# Altium footprint library TarabusLibrary.PcbLib: 591 footprints (part 13 of 37)
Each footprint in its own frame and in the unit in brackets; x right, y up, seen from the top. Pads: shape width x height; smd on the part's side, far side on the other; paste and mask are expansions set on the pad; w line width, h text height; cw(c..) or ccw(c..) is an arc to the next point about the centre after c.
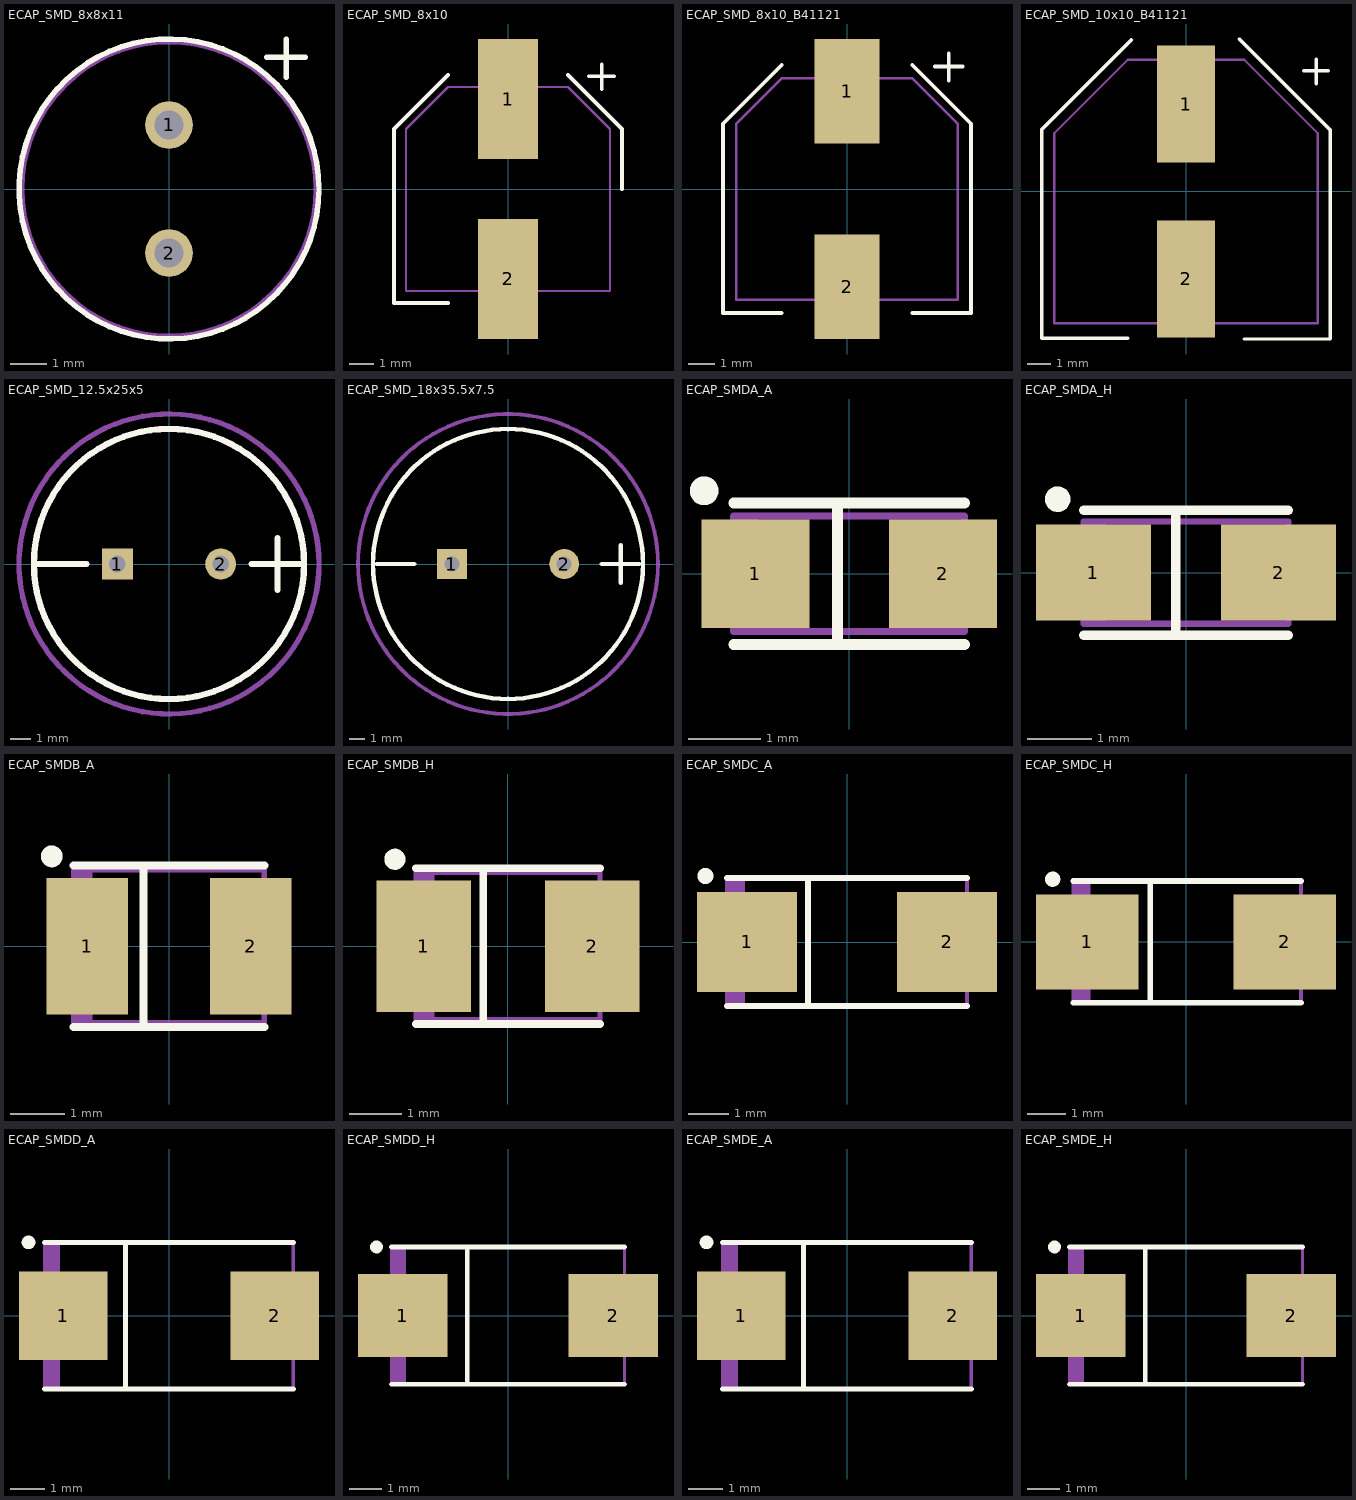
[diagram p12: the footprints below, top view; thin cyan lines are the x and y axes]

## ECAP_SMD_8x8x11 [mm]
pads (2):
  round 1.3 hole 0.8: 1(0,1.75) 2(0,-1.75)
Top Overlay:
  circle w0.15: c0,0 r4.1
  lines w0.15: 2.675,3.6 3.725,3.6 ; 3.2,3.05 3.2,4.1
Mechanical 7:
  circle w0.1: c0,0 r4
Mechanical 9:
  circle w0.1: c0,0 r4
Mechanical 10:
  text ".Comment" at 1,-4.75 h0.6
  text ".Designator" at 0.75,4.75 h0.8
3D body: height 12, standoff 0.5, extent -3.968,-3.992 4,3.992

## ECAP_SMD_8x10 [mm]
height 10
pads (2):
  rect 2.5x5 smd: 1(0,3.75) 2(0,-3.75)
Top Overlay:
  lines w0.15: -2.5,-4.75 -4.75,-4.75 -4.75,-4.25 -4.75,2.5 -2.5,4.75 ; 2.5,4.75 4.75,2.5 4.75,0 ; 3.375,4.7 4.425,4.7 ; 3.9,4.15 3.9,5.2
Mechanical 7:
  lines w0.1: -4.25,-4.25 -4.25,2.5 -2.5,4.25 2.5,4.25 4.25,2.5 4.25,-4.25 -4.25,-4.25
Mechanical 10:
  text ".Comment" at -1.125,-0.7 h0.6
  text ".Designator" at -1.05,0.3 h0.8
3D body "User Library-ALU-F.STEP": height 10.2, standoff 0, extent -4.15,-4.95 4.15,4.95

## ECAP_SMD_8x10_B41121 [mm]
height 10
pads (2):
  rect 2.5x4 smd: 1(0,3.75) 2(0,-3.75)
Top Overlay:
  lines w0.15: -2.5,-4.75 -4.75,-4.75 -4.75,2.5 -2.5,4.75 ; 2.5,-4.75 4.75,-4.75 4.75,2.5 2.5,4.75 ; 3.375,4.7 4.425,4.7 ; 3.9,4.15 3.9,5.2
Mechanical 7:
  lines w0.1: -4.25,-4.25 4.25,-4.25 4.25,2.5 2.5,4.25 -2.5,4.25 -4.25,2.5 -4.25,-4.25
Mechanical 10:
  text ".Designator" at -1.05,0.3 h0.8
  text ".Comment" at -1.125,-0.7 h0.6
3D body "User Library-ALU-F.STEP": height 10.2, standoff 0, extent -4.15,-4.95 4.15,4.95

## ECAP_SMD_10x10_B41121 [mm]
height 10
pads (2):
  rect 2.5x5 smd: 1(0,3.75) 2(0,-3.75)
Top Overlay:
  lines w0.15: -2.5,-6.3 -6.175,-6.3 -6.175,2.675 -2.338,6.513 ; 2.288,6.538 6.175,2.65 6.175,-6.325 2.5,-6.325 ; 5.05,5.175 6.1,5.175 ; 5.575,4.625 5.575,5.675
Mechanical 7:
  lines w0.1: -5.65,-5.65 -5.65,2.5 -2.5,5.65 2.5,5.65 5.65,2.5 5.65,-5.65 -5.65,-5.65
Mechanical 10:
  text ".Designator" at -1.05,0.3 h0.8
  text ".Comment" at -1.125,-0.7 h0.6

## ECAP_SMD_12.5x25x5 [mm] "12.5x25x5"
height 25
pads (2):
  rect 1.5x1.5 hole 0.8: 1(-2.5,0)
  round 1.5 hole 0.8: 2(2.5,0)
Top Overlay:
  circle w0.3: c0,0 r6.53
  lines w0.3: -6.5,0 -4,0 ; 4,0 6.5,0 ; 5.25,-1.25 5.25,1.25
Mechanical 1:
  circle w0.254: c0,0 r7.25

## ECAP_SMD_18x35.5x7.5 [mm] "18x35.5x7.5"
height 35.5
pads (2):
  rect 2x2 hole 1: 1(-3.75,0)
  round 2 hole 1: 2(3.75,0)
Top Overlay:
  circle w0.3: c0,0 r9
  lines w0.3: -8.75,0 -6.25,0 ; 6.25,0 8.75,0 ; 7.5,-1.25 7.5,1.25
Mechanical 1:
  circle w0.254: c0,0 r10

## ECAP_SMDA_A [mm]
height 1.6
pads (2):
  rect 1.5x1.5 smd: 1(-1.3,0) 2(1.3,0)
Top Overlay:
  circle w0.2: c-2.01,1.15 r0.1
  lines w0.15: -1.6,-0.98 1.6,-0.98 ; -1.6,0.98 1.6,0.98 ; -0.16,-0.98 -0.16,0.98
Mechanical 7:
  lines w0.1: -1.5,-0.8 -1.5,0.8 ; -1.4,-0.8 -1.4,0.8 ; -1.3,-0.8 -1.3,0.8 ; -1.6,-0.8 -1.6,0.8 1.6,0.8 1.6,-0.8 -1.6,-0.8
Mechanical 10:
  text ".Designator" at -0.84,1.25 h0.8
  text ".Comment" at -0.88,-1.58 h0.6
3D body: height 1.6, standoff 0, extent -1.6,-0.8 1.6,0.8

## ECAP_SMDA_H [mm]
height 1.6
pads (2):
  rect 1.8x1.5 smd: 1(-1.45,0) 2(1.45,0)
Top Overlay:
  circle w0.2: c-2.01,1.15 r0.1
  lines w0.15: -1.6,-0.98 1.6,-0.98 ; -1.6,0.98 1.6,0.98 ; -0.16,-0.98 -0.16,0.98
Mechanical 7:
  lines w0.1: -1.5,-0.8 -1.5,0.8 ; -1.4,-0.8 -1.4,0.8 ; -1.3,-0.8 -1.3,0.8 ; -1.6,-0.8 -1.6,0.8 1.6,0.8 1.6,-0.8 -1.6,-0.8
Mechanical 10:
  text ".Designator" at -0.84,1.25 h0.8
  text ".Comment" at -0.92,-1.56 h0.6
3D body: height 1.6, standoff 0, extent -1.6,-0.8 1.6,0.8

## ECAP_SMDB_A [mm]
height 1.9
pads (2):
  rect 1.5x2.5 smd: 1(-1.5,0) 2(1.5,0)
Top Overlay:
  circle w0.2: c-2.15,1.65 r0.1
  lines w0.15: -1.75,-1.48 1.75,-1.48 ; -1.75,1.48 1.75,1.48 ; -0.47,-1.48 -0.47,1.48
Mechanical 7:
  lines w0.1: -1.65,-1.4 -1.65,1.4 ; -1.55,-1.4 -1.55,1.4 ; -1.45,-1.4 -1.45,1.4 ; -1.75,-1.4 -1.75,1.4 1.75,1.4 1.75,-1.4 -1.75,-1.4
Mechanical 10:
  text ".Designator" at -0.9,1.7 h0.8
  text ".Comment" at -1.02,-2.08 h0.6
3D body: height 1.9, standoff 0, extent -1.75,-1.4 1.75,1.4

## ECAP_SMDB_H [mm]
height 1.9
pads (2):
  rect 1.8x2.5 smd: 1(-1.6,0) 2(1.6,0)
Top Overlay:
  circle w0.2: c-2.15,1.65 r0.1
  lines w0.15: -1.75,-1.48 1.75,-1.48 ; -1.75,1.48 1.75,1.48 ; -0.47,-1.48 -0.47,1.48
Mechanical 7:
  lines w0.1: -1.65,-1.4 -1.65,1.4 ; -1.55,-1.4 -1.55,1.4 ; -1.45,-1.4 -1.45,1.4 ; -1.75,-1.4 -1.75,1.4 1.75,1.4 1.75,-1.4 -1.75,-1.4
Mechanical 10:
  text ".Designator" at -0.9,1.7 h0.8
  text ".Comment" at -1.08,-2.08 h0.6
3D body: height 1.9, standoff 0, extent -1.75,-1.4 1.75,1.4

## ECAP_SMDC_A [mm]
height 2.5
pads (2):
  rect 2.5x2.5 smd: 1(-2.5,0) 2(2.5,0)
Top Overlay:
  circle w0.2: c-3.54,1.65 r0.1
  lines w0.15: -3,-1.6 3,-1.6 ; -3,1.6 3,1.6 ; -0.97,-1.6 -0.97,1.6
Mechanical 7:
  lines w0.1: -2.9,-1.6 -2.9,1.6 ; -2.8,-1.6 -2.8,1.6 ; -2.7,-1.6 -2.7,1.6 ; -2.6,-1.6 -2.6,1.6 ; -3,-1.6 3,-1.6 3,1.6 -3,1.6 -3,-1.6
Mechanical 10:
  text ".Designator" at -0.6,1.87 h0.8
  text ".Comment" at -0.47,-2.28 h0.6
3D body: height 2.5, standoff 0, extent -3,-1.6 3,1.6

## ECAP_SMDC_H [mm]
height 2.5
pads (2):
  rect 2.7x2.5 smd: 1(-2.6,0) 2(2.6,0)
Top Overlay:
  circle w0.2: c-3.51,1.65 r0.1
  lines w0.15: -2.97,-1.6 3.03,-1.6 ; -2.97,1.6 3.03,1.6 ; -0.94,-1.6 -0.94,1.6
Mechanical 7:
  lines w0.1: -2.87,-1.6 -2.87,1.6 ; -2.77,-1.6 -2.77,1.6 ; -2.67,-1.6 -2.67,1.6 ; -2.57,-1.6 -2.57,1.6 ; -2.97,-1.6 -2.97,1.6 3.03,1.6 3.03,-1.6 -2.97,-1.6
Mechanical 10:
  text ".Comment" at -0.7,-2.3 h0.6
  text ".Designator" at -0.6,1.89 h0.8
3D body: height 2.5, standoff 0, extent -2.97,-1.6 3.03,1.6

## ECAP_SMDD_A [mm]
height 2.8
pads (2):
  rect 2.6x2.6 smd: 1(-3.1,0) 2(3.1,0)
Top Overlay:
  circle w0.2: c-4.12,2.15 r0.1
  lines w0.15: -3.65,-2.15 3.65,-2.15 ; -3.65,2.15 3.65,2.15 ; -1.28,-2.15 -1.28,2.15
Mechanical 7:
  lines w0.1: -3.55,-2.15 -3.55,2.15 ; -3.45,-2.15 -3.45,2.15 ; -3.35,-2.15 -3.35,2.15 ; -3.25,-2.15 -3.25,2.15 ; -3.65,-2.15 3.65,-2.15 3.65,2.15 -3.65,2.15 -3.65,-2.15
Mechanical 10:
  text ".Designator" at -0.84,2.54 h0.8
  text ".Comment" at -0.9,-2.91 h0.6
3D body: height 2.8, standoff 0, extent -3.65,-2.15 3.65,2.15

## ECAP_SMDD_H [mm]
height 2.8
pads (2):
  rect 2.8x2.6 smd: 1(-3.3,0) 2(3.3,0)
Top Overlay:
  circle w0.2: c-4.12,2.15 r0.1
  lines w0.15: -3.65,-2.15 3.65,-2.15 ; -3.65,2.15 3.65,2.15 ; -1.28,-2.15 -1.28,2.15
Mechanical 7:
  lines w0.1: -3.55,-2.15 -3.55,2.15 ; -3.45,-2.15 -3.45,2.15 ; -3.35,-2.15 -3.35,2.15 ; -3.25,-2.15 -3.25,2.15 ; -3.65,-2.15 -3.65,2.15 3.65,2.15 3.65,-2.15 -3.65,-2.15
Mechanical 10:
  text ".Comment" at -0.83,-2.85 h0.6
  text ".Designator" at -0.84,2.54 h0.8
3D body: height 2.8, standoff 0, extent -3.65,-2.15 3.65,2.15

## ECAP_SMDE_A [mm]
height 4
pads (2):
  rect 2.6x2.6 smd: 1(-3.1,0) 2(3.1,0)
Top Overlay:
  circle w0.2: c-4.12,2.15 r0.1
  lines w0.15: -3.65,-2.15 3.65,-2.15 ; -3.65,2.15 3.65,2.15 ; -1.28,-2.15 -1.28,2.15
Mechanical 7:
  lines w0.1: -3.55,-2.15 -3.55,2.15 ; -3.45,-2.15 -3.45,2.15 ; -3.35,-2.15 -3.35,2.15 ; -3.25,-2.15 -3.25,2.15 ; -3.65,-2.15 3.65,-2.15 3.65,2.15 -3.65,2.15 -3.65,-2.15
Mechanical 10:
  text ".Designator" at -0.84,2.54 h0.8
  text ".Comment" at -0.78,-2.82 h0.6
3D body: height 4, standoff 0, extent -3.65,-2.15 3.65,2.15

## ECAP_SMDE_H [mm]
height 4
pads (2):
  rect 2.8x2.6 smd: 1(-3.3,0) 2(3.3,0)
Top Overlay:
  circle w0.2: c-4.12,2.15 r0.1
  lines w0.15: -3.65,-2.15 3.65,-2.15 ; -3.65,2.15 3.65,2.15 ; -1.28,-2.15 -1.28,2.15
Mechanical 7:
  lines w0.1: -3.55,-2.15 -3.55,2.15 ; -3.45,-2.15 -3.45,2.15 ; -3.35,-2.15 -3.35,2.15 ; -3.25,-2.15 -3.25,2.15 ; -3.65,-2.15 3.65,-2.15 3.65,2.15 -3.65,2.15 -3.65,-2.15
Mechanical 10:
  text ".Designator" at -0.84,2.54 h0.8
  text ".Comment" at -0.82,-2.87 h0.6
3D body: height 4, standoff 0, extent -3.65,-2.15 3.65,2.15